# Altium footprint library 排针排座.PcbLib: 344 footprints (part 21 of 22)
Each footprint in its own frame and in the unit in brackets; x right, y up, seen from the top. Pads: shape width x height; smd on the part's side, far side on the other; paste and mask are expansions set on the pad; w line width, h text height; cw(c..) or ccw(c..) is an arc to the next point about the centre after c.
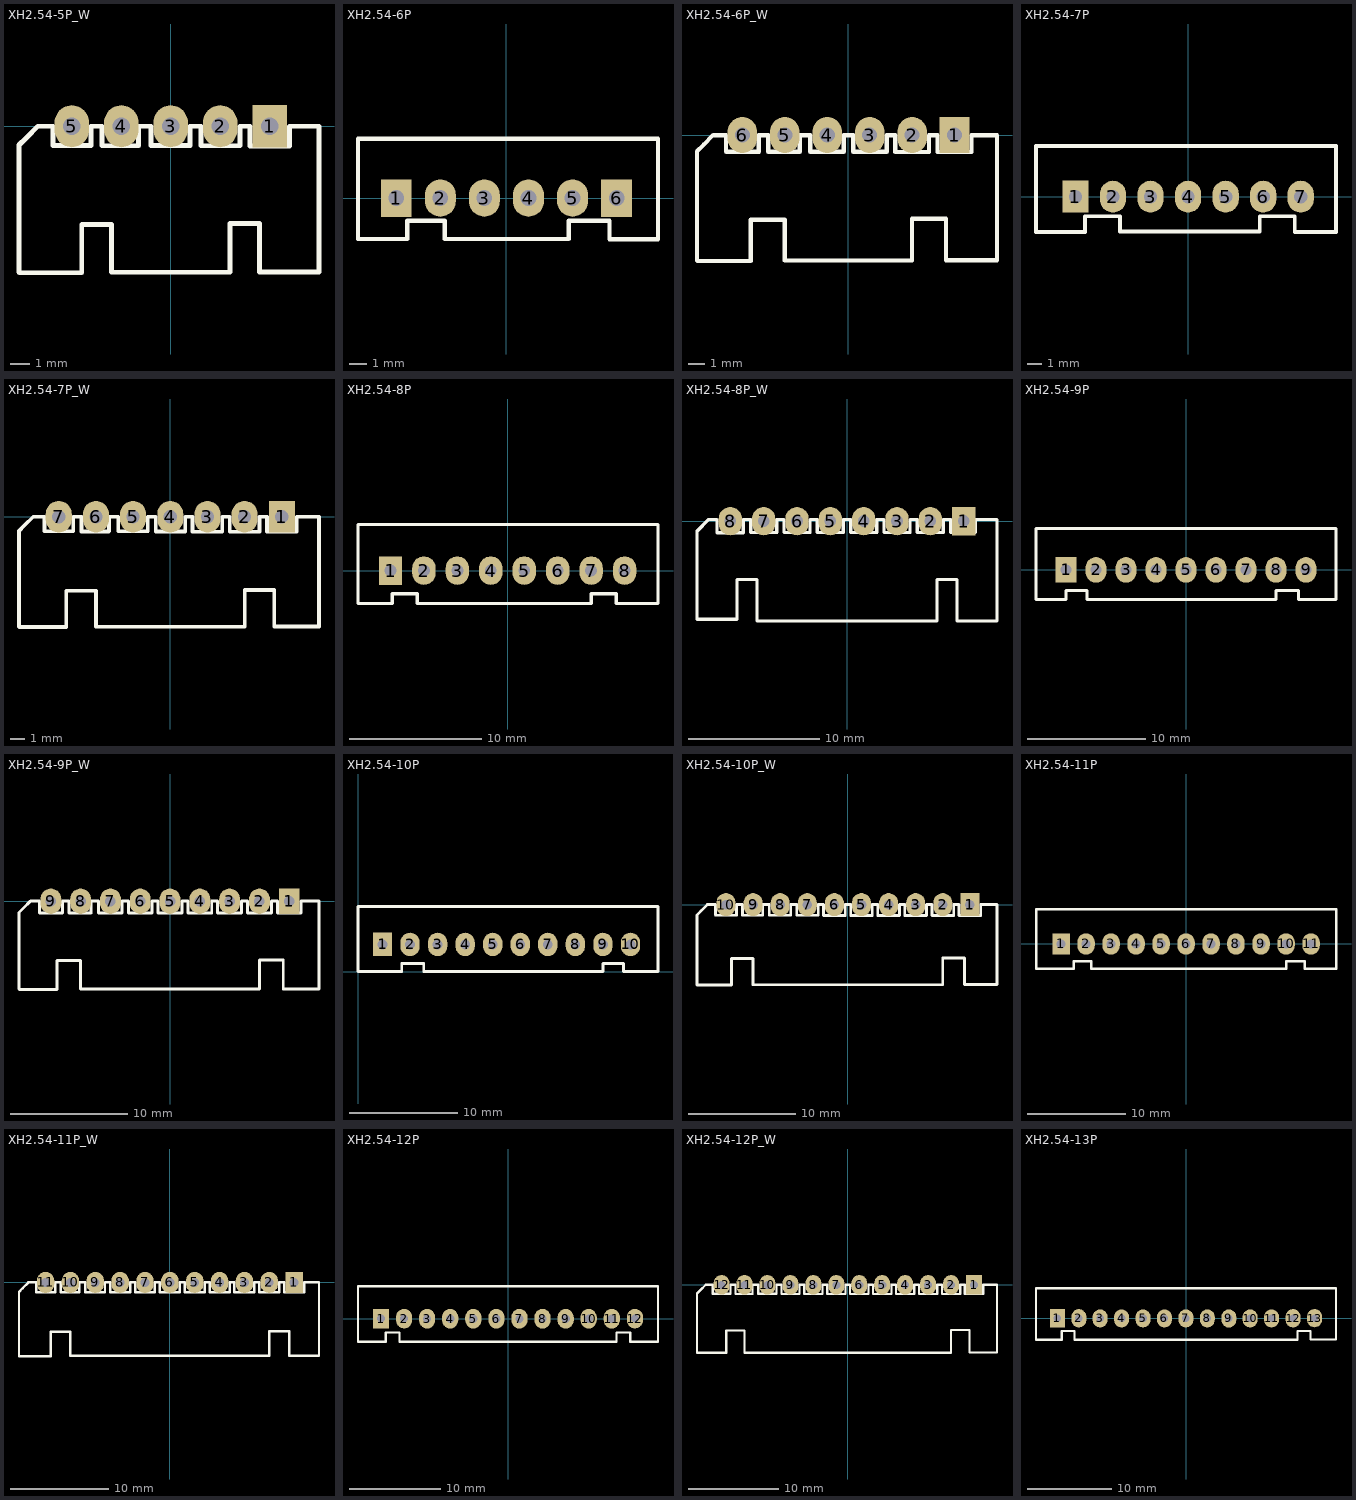
[diagram p20: the footprints below, top view; thin cyan lines are the x and y axes]

## XH2.54-5P_W [mil] "接插件，5P"
pads (5):
  rect 70x85 hole 35.43: 1(200,0)
  oval 70x85 hole 35.43: 2(100,0) 3(0,0) 4(-100,0) 5(-200,0)
Top Overlay:
  lines w10: -64.8,0 -64.8,-38.9 -65.35,-39.45 -138.82,-39.45 -138.82,0 -161.34,0 -161.34,-38.66 -160.79,-39.21 -237.8,-39.21 -238.35,-38.66 -238.35,0 -268.9,0 -291.81,-22.91 -306.93,-38.03 -306.93,-295.35 -305.91,-296.38 -180,-296.38 -180,-199.13 -120,-199.13 -120,-295.35 120,-295.35 120,-197.09 180,-197.09 180,-294.88 300,-294.88 300,0 240,0 240,-40 160,-40 160,0 140,0 140,-39.45 61.1,-39.45 61.1,0 ; -64.33,0 -40.79,0 ; -40.24,-39.21 -40.24,0 ; -39.45,-39.21 38.82,-39.21 39.06,-38.98 39.06,0 60.55,0
3D body "XH2.54-5P_H.STEP": height 225.59, standoff -132.68, extent -298.43,-289.37 298.43,13.78

## XH2.54-6P [mil] "接插件，6P"
pads (6):
  rect 70x85 hole 35.43: 1(-250,0) 6(250,0)
  oval 70x85 hole 35.43: 2(-150,0) 3(-50,0) 4(50,0) 5(150,0)
Top Overlay:
  lines w10: -337,-93 -225,-93 -225,-52 -140,-52 -140,-93 141,-93 141,-52 234,-52 234,-94 344,-94 344,135 -337,135 -337,-93
3D body "XH2.54-6P.STEP": height 276.77, standoff -97.24, extent -348.43,-94.49 348.42,129.92

## XH2.54-6P_W [mil] "接插件，6P"
pads (6):
  rect 70x85 hole 35.43: 1(250,0)
  oval 70x85 hole 35.43: 2(150,0) 3(50,0) 4(-50,0) 5(-150,0) 6(-250,0)
Top Overlay:
  lines w10: -114.8,0 -114.8,-38.9 -115.35,-39.45 -188.82,-39.45 -188.82,0 -211.34,0 -211.34,-38.66 -210.79,-39.21 -287.8,-39.21 -288.35,-38.66 -288.35,0 -318.9,0 -341.81,-22.91 -356.93,-38.03 -356.93,-295.35 -355.91,-296.38 -230,-296.38 -230,-199.13 -150,-199.13 -150,-295.35 150,-295.35 150,-197.09 230,-197.09 230,-294.88 350,-294.88 350,0 290,0 290,-40 210,-40 210,0 190,0 190,-40 110,-40 110,0 90,0 90,-39.45 11.1,-39.45 11.1,0 ; -114.33,0 -90.79,0 ; -90.24,-39.21 -90.24,0 ; -89.45,-39.21 -11.18,-39.21 -10.94,-38.98 -10.94,0 10.55,0
3D body "XH2.54-6P_H.STEP": height 226.38, standoff -131.89, extent -348.43,-289.37 348.43,13.78

## XH2.54-7P [mil] "接插件，7P"
pads (7):
  rect 70x85 hole 35.43: 1(-300,0)
  oval 70x85 hole 35.43: 2(-200,0) 3(-100,0) 4(0,0) 5(100,0) 6(200,0) 7(300,0)
Top Overlay:
  lines w10: -405,-94 -405,135 -287,135 394,135 394,-94 284,-94 284,-52 191,-52 191,-93 -90,-93 -181.55,-93 -181.55,-52 -274.55,-52 -274.55,-94 -405,-94
3D body "XH2.54-7P.STEP": height 277.56, standoff -96.46, extent -398.43,-94.41 398.43,130

## XH2.54-7P_W [mil] "接插件，7P"
pads (7):
  rect 70x85 hole 35.43: 1(300,0)
  oval 70x85 hole 35.43: 2(200,0) 3(100,0) 4(0,0) 5(-100,0) 6(-200,0) 7(-300,0)
Top Overlay:
  lines w10: -164.8,0 -164.8,-38.9 -165.35,-39.45 -238.82,-39.45 -238.82,0 -261.34,0 -261.34,-38.66 -260.79,-39.21 -337.8,-39.21 -338.35,-38.66 -338.35,0 -368.9,0 -391.81,-22.91 -406.93,-38.03 -406.93,-295.35 -405.91,-296.38 -280,-296.38 -280,-199.13 -200,-199.13 -200,-295.35 200,-295.35 200,-197.09 280,-197.09 280,-294.88 400,-294.88 400,0 340,0 340,-40 260,-40 260,0 240,0 240,-40 160,-40 160,0 140,0 140,-40 60,-40 60,0 40,0 40,-39.45 -38.9,-39.45 -38.9,0 ; -164.33,0 -140.79,0 ; -140.24,-39.21 -140.24,0 ; -139.45,-39.21 -61.18,-39.21 -60.94,-38.98 -60.94,0 -39.45,0
3D body "XH2.54-7P_H.STEP": height 226.38, standoff -131.89, extent -398.43,-289.37 398.43,13.78

## XH2.54-8P [mil] "接插件，8P"
pads (8):
  rect 70x85 hole 35.43: 1(-350,0)
  oval 70x85 hole 35.43: 2(-250,0) 3(-150,0) 4(-50,0) 5(50,0) 6(150,0) 7(250,0) 8(350,0)
Top Overlay:
  lines w10: -447.25,-98.42 -447.25,137.79 450,137.79 450,-98.43 325,-98.42 325,-68.9 250,-68.9 250,-98.42 -270,-98.42 -270,-68.9 -345,-68.9 -345,-98.42 -447.25,-98.42
3D body "XH2.54-8P.STEP": height 277.56, standoff -96.46, extent -448.43,-94.49 448.43,129.92

## XH2.54-8P_W [mil] "接插件，8P"
pads (8):
  rect 70x85 hole 35.43: 1(350,0)
  oval 70x85 hole 35.43: 2(250,0) 3(150,0) 4(50,0) 5(-50,0) 6(-150,0) 7(-250,0) 8(-350,0)
Top Overlay:
  lines w10: -289.45,5 -310.94,5 -310.94,-35 -390,-35 -390,5 -415,5 -450,-30 -450,-294.67 -330,-294.67 -330,-175 -270,-175 -270,-300 270,-300 270,-175 330,-175 330,-300 450,-300 450,5 385,5 385,-30 385,-34.45 311.1,-34.45 311.1,5 ; -288.9,5 -288.9,-34.45 -211.42,-34.45 -210.94,-33.98 -210.94,5 -189.45,5 ; -188.9,5 -188.9,-34.45 -111.42,-34.45 -110.94,-33.98 -110.94,5 -89.45,5 ; -88.9,5 -88.9,-34.45 -11.42,-34.45 -10.94,-33.98 -10.94,5 10.55,5 ; 11.1,5 11.1,-34.45 88.58,-34.45 89.06,-33.98 89.06,5 110.55,5 ; 111.1,5 111.1,-34.45 188.58,-34.45 189.06,-33.98 189.06,5 210.55,5 ; 211.1,5 211.1,-34.45 288.58,-34.45 289.06,-33.98 289.06,5 310.55,5
3D body "XH2.54-8P_H.STEP": height 226.38, standoff -131.89, extent -448.43,-289.37 448.43,13.78

## XH2.54-9P [mil] "接插件，9P"
pads (9):
  rect 70x85 hole 35.43: 1(-400,0)
  oval 70x85 hole 35.43: 2(-300,0) 3(-200,0) 4(-100,0) 5(0,0) 6(100,0) 7(200,0) 8(300,0) 9(400,0)
Top Overlay:
  lines w10: -500,-98.42 -400,-98.42 -400,-68.9 -330,-68.9 -330,-98.42 300,-98.42 300,-68.9 375,-68.9 375,-98.42 500,-98.43 500,137.79 -500,137.79 -500,-98.42
3D body "XH2.54-9P.STEP": height 277.56, standoff -131.89, extent -498.43,-94.49 498.43,129.92

## XH2.54-9P_W [mil] "接插件，9P"
pads (9):
  rect 70x85 hole 35.43: 1(400,0)
  oval 70x85 hole 35.43: 2(300,0) 3(200,0) 4(100,0) 5(0,0) 6(-100,0) 7(-200,0) 8(-300,0) 9(-400,0)
Top Overlay:
  lines w10: -264.8,0 -264.8,-38.9 -265.35,-39.45 -338.82,-39.45 -338.82,0 -361.34,0 -361.34,-38.66 -360.79,-39.21 -437.8,-39.21 -438.35,-38.66 -438.35,0 -468.9,0 -491.81,-22.91 -506.93,-38.03 -506.93,-295.35 -505.91,-296.38 -380,-296.38 -380,-199.13 -300,-199.13 -300,-295.35 300,-295.35 300,-197.09 380,-197.09 380,-294.88 500,-294.88 500,0 440,0 440,-40 360,-40 360,0 340,0 340,-40 260,-40 260,0 240,0 240,-40 160,-40 160,0 140,0 140,-40 60,-40 60,0 40,0 40,-40 -40,-40 -40,0 -60,0 -60,-39.45 -138.9,-39.45 -138.9,0 ; -264.33,0 -240.79,0 ; -240.24,-39.21 -240.24,0 ; -239.45,-39.21 -161.18,-39.21 -160.94,-38.98 -160.94,0 -139.45,0
3D body "XH2.54-9P_H.STEP": height 226.38, standoff -131.89, extent -498.43,-289.37 498.43,13.78

## XH2.54-10P [mil] "接插件，10P"
pads (10):
  rect 70x85 hole 35.43: 1(89,98.42)
  oval 70x85 hole 35.43: 2(189,98.42) 3(289,98.42) 4(389,98.42) 5(489,98.42) 6(589,98.42) 7(689,98.42) 8(789,98.42) 9(889,98.42) 10(989,98.42)
Top Overlay:
  lines w10: 0,0 159,0 159,29.53 239,29.53 239,0 889,0 889,29.53 964,29.53 964,0 1089,0 1089,236.22 0,236.22 0,0
3D body "XH2.54-10P.STEP": height 276.77, standoff -97.24, extent -9.43,3.94 1087.43,228.34

## XH2.54-10P_W [mil] "接插件，10P"
pads (10):
  rect 70x85 hole 35.43: 1(450,0)
  oval 70x85 hole 35.43: 2(350,0) 3(250,0) 4(150,0) 5(50,0) 6(-50,0) 7(-150,0) 8(-250,0) 9(-350,0) 10(-450,0)
Top Overlay:
  lines w10: -314.8,0 -314.8,-38.9 -315.35,-39.45 -388.82,-39.45 -388.82,0 -411.34,0 -411.34,-38.66 -410.79,-39.21 -487.8,-39.21 -488.35,-38.66 -488.35,0 -518.9,0 -541.81,-22.91 -556.93,-38.03 -556.93,-295.35 -555.91,-296.38 -430,-296.38 -430,-199.13 -350,-199.13 -350,-295.35 350,-295.35 350,-197.09 430,-197.09 430,-294.88 550,-294.88 550,0 490,0 490,-40 410,-40 410,0 390,0 390,-40 310,-40 310,0 290,0 290,-40 210,-40 210,0 190,0 190,-40 110,-40 110,0 90,0 90,-40 10,-40 10,0 -10,0 -10,-40 -90,-40 -90,0 -110,0 -110,-39.45 -188.9,-39.45 -188.9,0 ; -314.33,0 -290.79,0 ; -290.24,-39.21 -290.24,0 ; -289.45,-39.21 -211.18,-39.21 -210.94,-38.98 -210.94,0 -189.45,0
3D body "XH2.54-10P_H.STEP": height 225.59, standoff -132.68, extent -548.43,-289.37 548.43,13.78

## XH2.54-11P [mil] "接插件，11P"
pads (11):
  rect 70x85 hole 35.43: 1(-500,0)
  oval 70x85 hole 35.43: 2(-400,0) 3(-300,0) 4(-200,0) 5(-100,0) 6(0,0) 7(100,0) 8(200,0) 9(300,0) 10(400,0) 11(500,0)
Top Overlay:
  lines w10: -600,-98.42 -450,-98.42 -450,-68.9 -380,-68.9 -380,-98.42 400,-98.42 400,-68.9 475,-68.9 475,-98.42 600,-98.43 600,137.79 -600,137.79 -600,-98.42
3D body "XH2.54-11P.STEP": height 276.77, standoff -132.68, extent -598.43,-94.49 598.43,129.92

## XH2.54-11P_W [mil] "接插件，11P"
pads (11):
  rect 70x85 hole 35.43: 1(500,0)
  oval 70x85 hole 35.43: 2(400,0) 3(300,0) 4(200,0) 5(100,0) 6(0,0) 7(-100,0) 8(-200,0) 9(-300,0) 10(-400,0) 11(-500,0)
Top Overlay:
  lines w10: -364.8,0 -364.8,-38.9 -365.35,-39.45 -438.82,-39.45 -438.82,0 -461.34,0 -461.34,-38.66 -460.79,-39.21 -537.8,-39.21 -538.35,-38.66 -538.35,0 -568.9,0 -591.81,-22.91 -606.93,-38.03 -606.93,-295.35 -605.91,-296.38 -480,-296.38 -480,-199.13 -400,-199.13 -400,-295.35 400,-295.35 400,-197.09 480,-197.09 480,-294.88 600,-294.88 600,0 540,0 540,-40 460,-40 460,0 440,0 440,-40 360,-40 360,0 340,0 340,-40 260,-40 260,0 240,0 240,-40 160,-40 160,0 140,0 140,-40 60,-40 60,0 40,0 40,-40 -40,-40 -40,0 -60,0 -60,-40 -140,-40 -140,0 -160,0 -160,-39.45 -238.9,-39.45 -238.9,0 ; -364.33,0 -340.79,0 ; -340.24,-39.21 -340.24,0 ; -339.45,-39.21 -261.18,-39.21 -260.94,-38.98 -260.94,0 -239.45,0
3D body "XH2.54-11P_H.STEP": height 225.59, standoff -132.68, extent -598.43,-289.37 598.43,13.78

## XH2.54-12P [mil] "接插件，12P"
pads (12):
  rect 70x85 hole 35.43: 1(-550,0.37)
  oval 70x85 hole 35.43: 2(-450,0.37) 3(-350.5,-0.13) 4(-250.5,-0.13) 5(-150.5,-0.13) 6(-50.5,-0.13) 7(49.5,-0.13) 8(149.5,-0.13) 9(250,-0.37) 10(349.5,-0.13) 11(449.5,-0.13) 12(550,0.37)
Top Overlay:
  lines w10: -650,-99.63 -650,140.37 649.83,140.37 649.83,79.72 649.83,-99.63 530,-99.63 530,-59.63 470,-59.63 470,-99.63 -470,-99.63 -470,-59.63 -530,-59.63 -530,-99.63 -650,-99.63
3D body "XH2.54-12P.STEP": height 277.56, standoff -96.46, extent -648.43,-94.12 648.43,130.29

## XH2.54-12P_W [mil] "接插件，12P"
pads (12):
  rect 70x85 hole 35.43: 1(550,0)
  oval 70x85 hole 35.43: 2(450,0) 3(350,0) 4(250,0) 5(150,0) 6(50,0) 7(-50,0) 8(-150,0) 9(-250,0) 10(-350,0) 11(-450,0) 12(-550,0)
Top Overlay:
  lines w10: -414.8,0 -414.8,-38.9 -415.35,-39.45 -488.82,-39.45 -488.82,0 -511.34,0 -511.34,-38.66 -510.79,-39.21 -587.8,-39.21 -588.35,-38.66 -588.35,0 -618.9,0 -641.81,-22.91 -656.93,-38.03 -656.93,-295.35 -655.91,-296.38 -530,-296.38 -530,-199.13 -450,-199.13 -450,-295.35 450,-295.35 450,-197.09 530,-197.09 530,-294.88 650,-294.88 650,0 590,0 590,-40 510,-40 510,0 490,0 490,-40 410,-40 410,0 390,0 390,-40 310,-40 310,0 290,0 290,-40 210,-40 210,0 190,0 190,-40 110,-40 110,0 90,0 90,-40 10,-40 10,0 -10,0 -10,-40 -90,-40 -90,0 -110,0 -110,-40 -190,-40 -190,0 -210,0 -210,-39.45 -288.9,-39.45 -288.9,0 ; -414.33,0 -390.79,0 ; -390.24,-39.21 -390.24,0 ; -389.45,-39.21 -311.18,-39.21 -310.94,-38.98 -310.94,0 -289.45,0
3D body "XH2.54-12P_H.STEP": height 226.38, standoff -131.89, extent -648.43,-289.37 648.43,13.78

## XH2.54-13P [mil] "接插件，13P"
pads (13):
  rect 70x85 hole 35.43: 1(-600.25,0.12)
  oval 70x85 hole 35.43: 2(-500.25,0.12) 3(-400.75,-0.38) 4(-300.75,-0.38) 5(-200.75,-0.38) 6(-100.75,-0.38) 7(-0.75,-0.38) 8(99.25,-0.38) 9(199.75,-0.62) 10(299.25,-0.38) 11(399.25,-0.38) 12(499.75,0.12) 13(600.25,0.62)
Top Overlay:
  lines w10: 520.25,-99.88 -520.25,-99.88 -520.25,-59.88 -580.25,-59.88 -580.25,-99.88 -700.25,-99.88 -700.25,140.12 700.08,140.12 700.08,79.97 700.08,-99.38 580.25,-99.38 580.25,-59.38 520.25,-59.38 520.25,-99.38
3D body "XH2.54-13P.step": height 279.53, standoff -133.86, extent -695.25,-91.17 689,137.17